# Altium footprint library ref-packages.PCBLIB: 1543 footprints (part 49 of 103)
Each footprint in its own frame and in the unit in brackets; x right, y up, seen from the top. Pads: shape width x height; smd on the part's side, far side on the other; paste and mask are expansions set on the pad; w line width, h text height; cw(c..) or ccw(c..) is an arc to the next point about the centre after c.
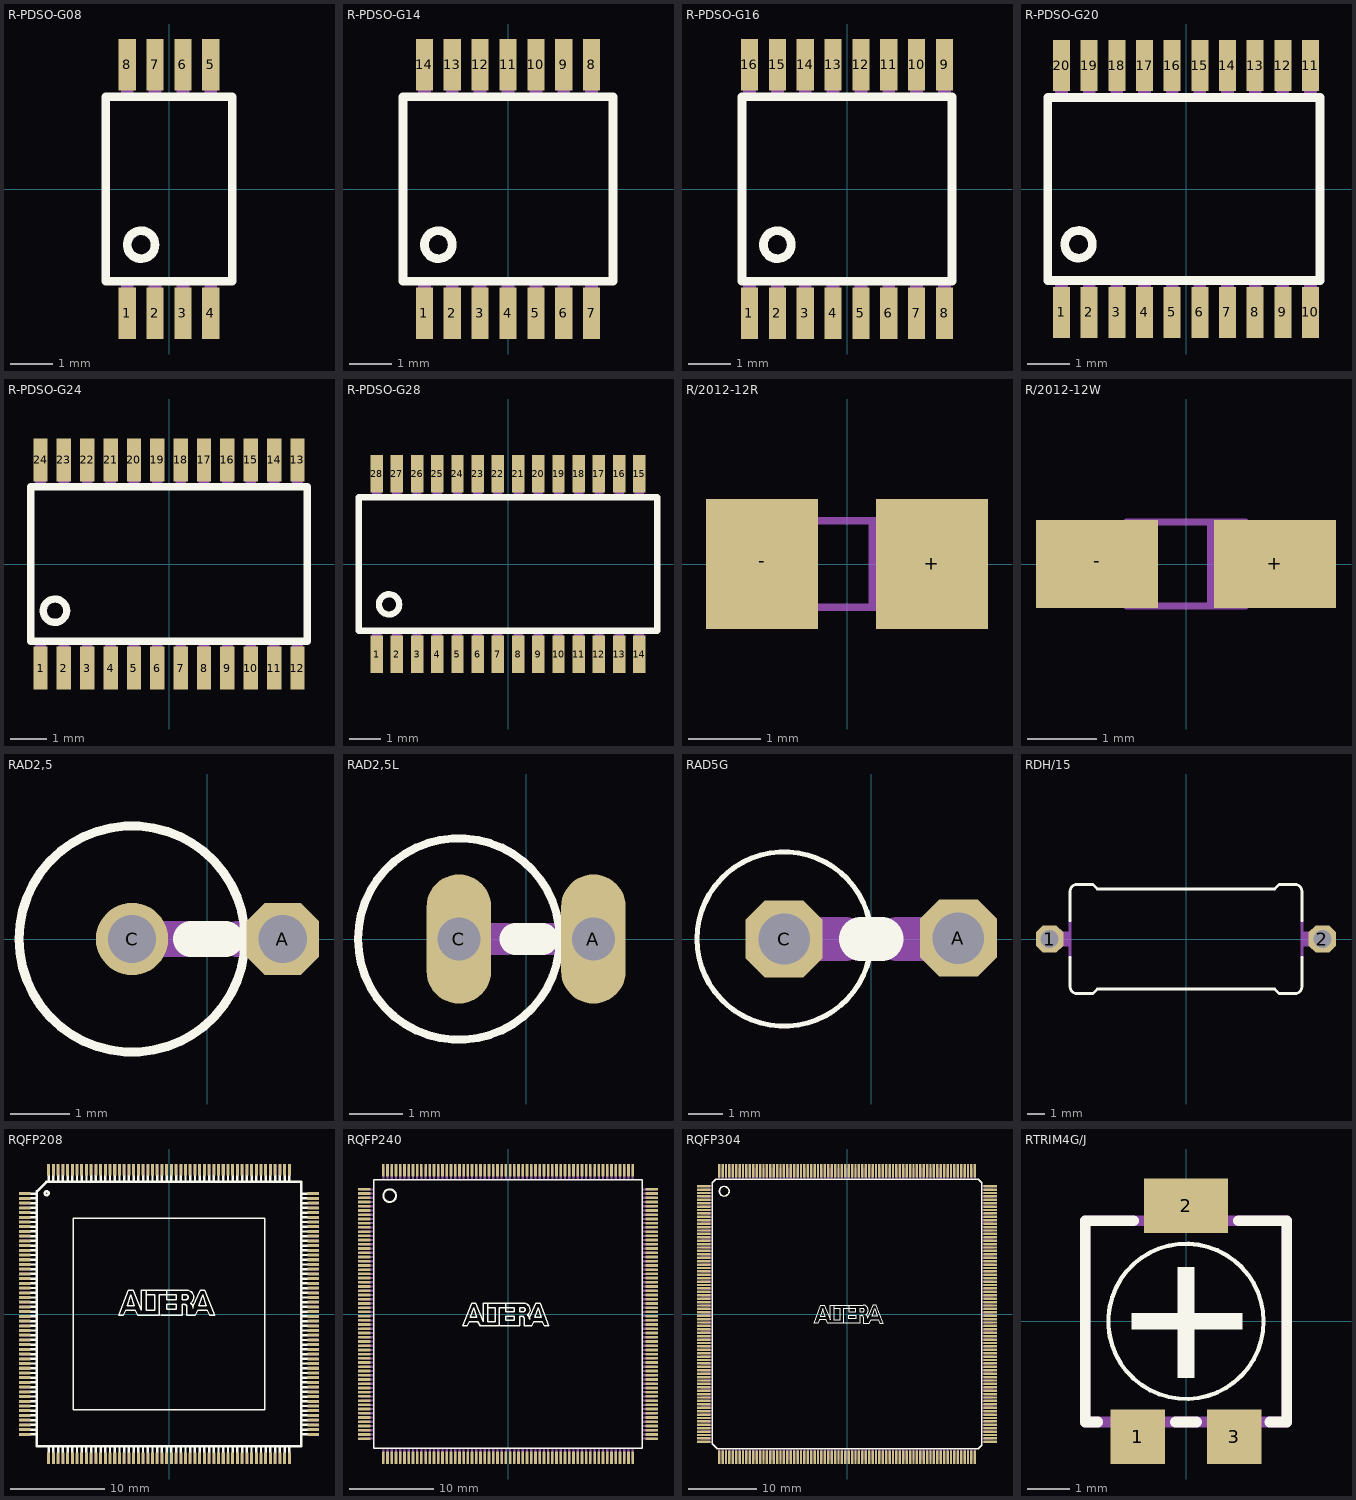
[diagram p48: the footprints below, top view; thin cyan lines are the x and y axes]

## R-PDSO-G08 [mil]
pads (8):
  rect 15.75x47.24 smd: 1(-38.39,-114.17) 2(-12.8,-114.17) 3(12.8,-114.17) 4(38.39,-114.17) 5(38.39,114.17) 6(12.8,114.17) 7(-12.8,114.17) 8(-38.39,114.17)
Top Overlay:
  circle w8: c-25.59,-51.18 r12.8
  lines w8: -58.07,-84.65 58.07,-84.65 58.07,84.65 -58.07,84.65 -58.07,-84.65
Mechanical 16:
  rectangle: -44.29,-129.92 -32.48,-87.8
  rectangle: -18.7,-129.92 -6.89,-87.8
  rectangle: 6.89,-129.92 18.7,-87.8
  rectangle: 32.48,-129.92 44.29,-87.8
  region: 44.29,129.92 32.48,129.92 32.48,87.8 44.29,87.8
  region: 18.7,129.92 6.89,129.92 6.89,87.8 18.7,87.8
  region: -6.89,129.92 -18.7,129.92 -18.7,87.8 -6.89,87.8
  region: -32.48,129.92 -44.29,129.92 -44.29,87.8 -32.48,87.8

## R-PDSO-G14 [mm]
pads (14):
  rect 0.4x1.2 smd: 1(-1.95,-2.9) 2(-1.3,-2.9) 3(-0.65,-2.9) 4(0,-2.9) 5(0.65,-2.9) 6(1.3,-2.9) 7(1.95,-2.9) 8(1.95,2.9) 9(1.3,2.9) 10(0.65,2.9) 11(0,2.9) 12(-0.65,2.9) 13(-1.3,2.9) 14(-1.95,2.9)
Top Overlay:
  circle w0.203: c-1.625,-1.3 r0.325
  lines w0.203: -2.45,-2.15 2.45,-2.15 2.45,2.15 -2.45,2.15 -2.45,-2.15
Mechanical 16:
  rectangle: -2.1,-3.3 -1.8,-2.23
  rectangle: -1.45,-3.3 -1.15,-2.23
  rectangle: -0.8,-3.3 -0.5,-2.23
  rectangle: -0.15,-3.3 0.15,-2.23
  rectangle: 0.5,-3.3 0.8,-2.23
  rectangle: 1.15,-3.3 1.45,-2.23
  rectangle: 1.8,-3.3 2.1,-2.23
  region: 2.1,3.3 1.8,3.3 1.8,2.23 2.1,2.23
  region: 1.45,3.3 1.15,3.3 1.15,2.23 1.45,2.23
  region: 0.8,3.3 0.5,3.3 0.5,2.23 0.8,2.23
  region: 0.15,3.3 -0.15,3.3 -0.15,2.23 0.15,2.23
  region: -0.5,3.3 -0.8,3.3 -0.8,2.23 -0.5,2.23
  region: -1.15,3.3 -1.45,3.3 -1.45,2.23 -1.15,2.23
  region: -1.8,3.3 -2.1,3.3 -2.1,2.23 -1.8,2.23

## R-PDSO-G16 [mil]
pads (16):
  rect 15.75x47.24 smd: 1(-89.57,-114.17) 2(-63.98,-114.17) 3(-38.39,-114.17) 4(-12.8,-114.17) 5(12.8,-114.17) 6(38.39,-114.17) 7(63.98,-114.17) 8(89.57,-114.17) 9(89.57,114.17) 10(63.98,114.17) 11(38.39,114.17) 12(12.8,114.17) 13(-12.8,114.17) 14(-38.39,114.17) 15(-63.98,114.17) 16(-89.57,114.17)
Top Overlay:
  circle w8: c-63.98,-51.18 r12.8
  lines w8: -96.46,-84.65 96.46,-84.65 96.46,84.65 -96.46,84.65 -96.46,-84.65
Mechanical 16:
  rectangle: -95.47,-129.92 -83.66,-87.8
  rectangle: -69.88,-129.92 -58.07,-87.8
  rectangle: -44.29,-129.92 -32.48,-87.8
  rectangle: -18.7,-129.92 -6.89,-87.8
  rectangle: 6.89,-129.92 18.7,-87.8
  rectangle: 32.48,-129.92 44.29,-87.8
  rectangle: 58.07,-129.92 69.88,-87.8
  rectangle: 83.66,-129.92 95.47,-87.8
  region: 95.47,129.92 83.66,129.92 83.66,87.8 95.47,87.8
  region: 69.88,129.92 58.07,129.92 58.07,87.8 69.88,87.8
  region: 44.29,129.92 32.48,129.92 32.48,87.8 44.29,87.8
  region: 18.7,129.92 6.89,129.92 6.89,87.8 18.7,87.8
  region: -6.89,129.92 -18.7,129.92 -18.7,87.8 -6.89,87.8
  region: -32.48,129.92 -44.29,129.92 -44.29,87.8 -32.48,87.8
  region: -58.07,129.92 -69.88,129.92 -69.88,87.8 -58.07,87.8
  region: -83.66,129.92 -95.47,129.92 -95.47,87.8 -83.66,87.8

## R-PDSO-G20 [mil]
pads (20):
  rect 15.75x47.24 smd: 1(-115.16,-114.17) 2(-89.57,-114.17) 3(-63.98,-114.17) 4(-38.39,-114.17) 5(-12.8,-114.17) 6(12.8,-114.17) 7(38.39,-114.17) 8(63.98,-114.17) 9(89.57,-114.17) 10(115.16,-114.17) 11(115.16,114.17) 12(89.57,114.17) 13(63.98,114.17) 14(38.39,114.17) 15(12.8,114.17) 16(-12.8,114.17) 17(-38.39,114.17) 18(-63.98,114.17) 19(-89.57,114.17) 20(-115.16,114.17)
Top Overlay:
  circle w8: c-99.41,-51.18 r12.8
  lines w8: -127.95,-84.65 124.02,-84.65 124.02,84.65 -127.95,84.65 -127.95,-84.65
Mechanical 16:
  rectangle: -121.06,-129.92 -109.25,-87.8
  rectangle: -95.47,-129.92 -83.66,-87.8
  rectangle: -69.88,-129.92 -58.07,-87.8
  rectangle: -44.29,-129.92 -32.48,-87.8
  rectangle: -18.7,-129.92 -6.89,-87.8
  rectangle: 6.89,-129.92 18.7,-87.8
  rectangle: 32.48,-129.92 44.29,-87.8
  rectangle: 58.07,-129.92 69.88,-87.8
  rectangle: 83.66,-129.92 95.47,-87.8
  rectangle: 109.25,-129.92 121.06,-87.8
  region: 121.06,129.92 109.25,129.92 109.25,87.8 121.06,87.8
  region: 95.47,129.92 83.66,129.92 83.66,87.8 95.47,87.8
  region: 69.88,129.92 58.07,129.92 58.07,87.8 69.88,87.8
  region: 44.29,129.92 32.48,129.92 32.48,87.8 44.29,87.8
  region: 18.7,129.92 6.89,129.92 6.89,87.8 18.7,87.8
  region: -6.89,129.92 -18.7,129.92 -18.7,87.8 -6.89,87.8
  region: -32.48,129.92 -44.29,129.92 -44.29,87.8 -32.48,87.8
  region: -58.07,129.92 -69.88,129.92 -69.88,87.8 -58.07,87.8
  region: -83.66,129.92 -95.47,129.92 -95.47,87.8 -83.66,87.8
  region: -109.25,129.92 -121.06,129.92 -121.06,87.8 -109.25,87.8

## R-PDSO-G24 [mil]
pads (24):
  rect 15.75x47.24 smd: 1(-140.75,-114.17) 2(-115.16,-114.17) 3(-89.57,-114.17) 4(-63.98,-114.17) 5(-38.39,-114.17) 6(-12.8,-114.17) 7(12.8,-114.17) 8(38.39,-114.17) 9(63.98,-114.17) 10(89.57,-114.17) 11(115.16,-114.17) 12(140.75,-114.17) 13(140.75,114.17) 14(115.16,114.17) 15(89.57,114.17) 16(63.98,114.17) 17(38.39,114.17) 18(12.8,114.17) 19(-12.8,114.17) 20(-38.39,114.17) 21(-63.98,114.17) 22(-89.57,114.17) 23(-115.16,114.17) 24(-140.75,114.17)
Top Overlay:
  circle w8: c-125,-51.18 r12.8
  lines w8: -151.57,-84.65 151.57,-84.65 151.57,84.65 -151.57,84.65 -151.57,-84.65
Mechanical 16:
  rectangle: -146.65,-129.92 -134.84,-87.8
  rectangle: -121.06,-129.92 -109.25,-87.8
  rectangle: -95.47,-129.92 -83.66,-87.8
  rectangle: -69.88,-129.92 -58.07,-87.8
  rectangle: -44.29,-129.92 -32.48,-87.8
  rectangle: -18.7,-129.92 -6.89,-87.8
  rectangle: 6.89,-129.92 18.7,-87.8
  rectangle: 32.48,-129.92 44.29,-87.8
  rectangle: 58.07,-129.92 69.88,-87.8
  rectangle: 83.66,-129.92 95.47,-87.8
  rectangle: 109.25,-129.92 121.06,-87.8
  rectangle: 134.84,-129.92 146.65,-87.8
  region: 146.65,129.92 134.84,129.92 134.84,87.8 146.65,87.8
  region: 121.06,129.92 109.25,129.92 109.25,87.8 121.06,87.8
  region: 95.47,129.92 83.66,129.92 83.66,87.8 95.47,87.8
  region: 69.88,129.92 58.07,129.92 58.07,87.8 69.88,87.8
  region: 44.29,129.92 32.48,129.92 32.48,87.8 44.29,87.8
  region: 18.7,129.92 6.89,129.92 6.89,87.8 18.7,87.8
  region: -6.89,129.92 -18.7,129.92 -18.7,87.8 -6.89,87.8
  region: -32.48,129.92 -44.29,129.92 -44.29,87.8 -32.48,87.8
  region: -58.07,129.92 -69.88,129.92 -69.88,87.8 -58.07,87.8
  region: -83.66,129.92 -95.47,129.92 -95.47,87.8 -83.66,87.8
  region: -109.25,129.92 -121.06,129.92 -121.06,87.8 -109.25,87.8
  region: -134.84,129.92 -146.65,129.92 -146.65,87.8 -134.84,87.8

## R-PDSO-G28 [mil]
pads (28):
  rect 15.75x47.24 smd: 1(-166.34,-114.17) 2(-140.75,-114.17) 3(-115.16,-114.17) 4(-89.57,-114.17) 5(-63.98,-114.17) 6(-38.39,-114.17) 7(-12.8,-114.17) 8(12.8,-114.17) 9(38.39,-114.17) 10(63.98,-114.17) 11(89.57,-114.17) 12(115.16,-114.17) 13(140.75,-114.17) 14(166.34,-114.17) 15(166.34,114.17) 16(140.75,114.17) 17(115.16,114.17) 18(89.57,114.17) 19(63.98,114.17) 20(38.39,114.17) 21(12.8,114.17) 22(-12.8,114.17) 23(-38.39,114.17) 24(-63.98,114.17) 25(-89.57,114.17) 26(-115.16,114.17) 27(-140.75,114.17) 28(-166.34,114.17)
Top Overlay:
  circle w8: c-150.59,-51.18 r12.8
  lines w8: -188.98,-84.65 188.98,-84.65 188.98,84.65 -188.98,84.65 -188.98,-84.65
Mechanical 16:
  rectangle: -172.24,-129.92 -160.43,-87.8
  rectangle: -146.65,-129.92 -134.84,-87.8
  rectangle: -121.06,-129.92 -109.25,-87.8
  rectangle: -95.47,-129.92 -83.66,-87.8
  rectangle: -69.88,-129.92 -58.07,-87.8
  rectangle: -44.29,-129.92 -32.48,-87.8
  rectangle: -18.7,-129.92 -6.89,-87.8
  rectangle: 6.89,-129.92 18.7,-87.8
  rectangle: 32.48,-129.92 44.29,-87.8
  rectangle: 58.07,-129.92 69.88,-87.8
  rectangle: 83.66,-129.92 95.47,-87.8
  rectangle: 109.25,-129.92 121.06,-87.8
  rectangle: 134.84,-129.92 146.65,-87.8
  rectangle: 160.43,-129.92 172.24,-87.8
  region: 172.24,129.92 160.43,129.92 160.43,87.8 172.24,87.8
  region: 146.65,129.92 134.84,129.92 134.84,87.8 146.65,87.8
  region: 121.06,129.92 109.25,129.92 109.25,87.8 121.06,87.8
  region: 95.47,129.92 83.66,129.92 83.66,87.8 95.47,87.8
  region: 69.88,129.92 58.07,129.92 58.07,87.8 69.88,87.8
  region: 44.29,129.92 32.48,129.92 32.48,87.8 44.29,87.8
  region: 18.7,129.92 6.89,129.92 6.89,87.8 18.7,87.8
  region: -6.89,129.92 -18.7,129.92 -18.7,87.8 -6.89,87.8
  region: -32.48,129.92 -44.29,129.92 -44.29,87.8 -32.48,87.8
  region: -58.07,129.92 -69.88,129.92 -69.88,87.8 -58.07,87.8
  region: -83.66,129.92 -95.47,129.92 -95.47,87.8 -83.66,87.8
  region: -109.25,129.92 -121.06,129.92 -121.06,87.8 -109.25,87.8
  region: -134.84,129.92 -146.65,129.92 -146.65,87.8 -134.84,87.8
  region: -160.43,129.92 -172.24,129.92 -172.24,87.8 -160.43,87.8

## R/2012-12R [mm]
pads (2):
  rect 1.55x1.8 smd: +(1.175,0) -(-1.175,0)
Mechanical 16:
  rectangle: -1,-0.45 -0.875,0.45
  rectangle: 0.875,-0.45 1,0.45
  rectangle: 0.3,-0.625 0.5,0.625
  lines w0.102: -0.85,-0.6 0.85,-0.6 0.85,0.6 -0.85,0.6 -0.85,-0.6

## R/2012-12W [mil]
pads (2):
  rect 68.9x49.61 smd: +(50.2,0) -(-50.2,0)
Mechanical 16:
  rectangle: -39.37,-17.72 -34.45,17.72
  rectangle: 34.45,-17.72 39.37,17.72
  rectangle: 11.81,-24.61 19.69,24.61
  lines w4: -33.46,-23.62 33.46,-23.62 33.46,23.62 -33.46,23.62 -33.46,-23.62

## RAD2,5 [mil]
pads (2):
  oct 48x48 hole 32: A(50,0)
  round 48 hole 32: C(-50,0)
Top Overlay:
  circle w6: c-50,0 r75
  lines w24: -11,0 12,0
Mechanical 16:
  lines w24: -50,0 -15,0 ; 20,0 50,0

## RAD2,5L [mil]
pads (2):
  oval 48x96 hole 32: A(50,0) C(-50,0)
Top Overlay:
  circle w6: c-50,0 r75
  lines w24: -8,0 12,0
Mechanical 16:
  lines w24: -50,0 -15,0 ; 15,0 50,0

## RAD5G [mil]
pads (2):
  oct 88.5x88.5 hole 59: A(100,1) C(-100,0)
Top Overlay:
  circle w6: c-100,0 r100
  lines w50: -12,0 12,0
Mechanical 16:
  lines w50: -100,0 -30,0 ; 30,0 100,0

## RDH/15 [mil]
pads (2):
  oct 60x60 hole 40: 1(-300,0) 2(300,0)
Top Overlay:
  lines w6: -255,-40 -255,-105 ccw(c-240,-105) -240,-120 -205,-120 -195,-110 195,-110 205,-120 240,-120 ccw(c240,-105) 255,-105 255,-40 ; -255,40 -255,105 cw(c-240,105) -240,120 -205,120 -195,110 195,110 205,120 240,120 cw(c240,105) 255,105 255,40
Mechanical 16:
  rectangle: -266,-16 -254,16
  rectangle: 254,-16 266,16
  lines w6: -255,-40 -255,40 ; 255,-40 255,40
  lines w32: -300,0 -270,0 ; 270,0 300,0
  text "RDH" at 180,-68 h77.5

## RQFP208 [mil]
pads (208):
  rect 47.24x12.6 smd: 1(-602.36,501.97) 2(-602.36,482.28) 3(-602.36,462.6) 4(-602.36,442.91) 5(-602.36,423.23) 6(-602.36,403.54) 7(-602.36,383.86) 8(-602.36,364.17) 9(-602.36,344.49) 10(-602.36,324.8) 11(-602.36,305.12) 12(-602.36,285.43) 13(-602.36,265.75) 14(-602.36,246.06) 15(-602.36,226.38) 16(-602.36,206.69) 17(-602.36,187.01) 18(-602.36,167.32) 19(-602.36,147.64) 20(-602.36,127.95) 21(-602.36,108.27) 22(-602.36,88.58) 23(-602.36,68.9) 24(-602.36,49.21) 25(-602.36,29.53) 26(-602.36,9.84) 27(-602.36,-9.84) 28(-602.36,-29.53) 29(-602.36,-49.21) 30(-602.36,-68.9) 31(-602.36,-88.58) 32(-602.36,-108.27) 33(-602.36,-127.95) 34(-602.36,-147.64) 35(-602.36,-167.32) 36(-602.36,-187.01) 37(-602.36,-206.69) 38(-602.36,-226.38) 39(-602.36,-246.06) 40(-602.36,-265.75) 41(-602.36,-285.43) 42(-602.36,-305.12) 43(-602.36,-324.8) 44(-602.36,-344.49) 45(-602.36,-364.17) 46(-602.36,-383.86) 47(-602.36,-403.54) 48(-602.36,-423.23) 49(-602.36,-442.91) 50(-602.36,-462.6) 51(-602.36,-482.28) 52(-602.36,-501.97) 105(602.36,-501.97) 106(602.36,-482.28) 107(602.36,-462.6) 108(602.36,-442.91) 109(602.36,-423.23) 110(602.36,-403.54) 111(602.36,-383.86) 112(602.36,-364.17) 113(602.36,-344.49) 114(602.36,-324.8) 115(602.36,-305.12) 116(602.36,-285.43) 117(602.36,-265.75) 118(602.36,-246.06) 119(602.36,-226.38) 120(602.36,-206.69) 121(602.36,-187.01) 122(602.36,-167.32) 123(602.36,-147.64) 124(602.36,-127.95) 125(602.36,-108.27) 126(602.36,-88.58) 127(602.36,-68.9) 128(602.36,-49.21) 129(602.36,-29.53) 130(602.36,-9.84) 131(602.36,9.84) 132(602.36,29.53) 133(602.36,49.21) 134(602.36,68.9) 135(602.36,88.58) 136(602.36,108.27) 137(602.36,127.95) 138(602.36,147.64) 139(602.36,167.32) 140(602.36,187.01) 141(602.36,206.69) 142(602.36,226.38) 143(602.36,246.06) 144(602.36,265.75) 145(602.36,285.43) 146(602.36,305.12) 147(602.36,324.8) 148(602.36,344.49) 149(602.36,364.17) 150(602.36,383.86) 151(602.36,403.54) 152(602.36,423.23) 153(602.36,442.91) 154(602.36,462.6) 155(602.36,482.28) 156(602.36,501.97)
  rect 12.6x47.24 smd: 53(-501.97,-602.36) 54(-482.28,-602.36) 55(-462.6,-602.36) 56(-442.91,-602.36) 57(-423.23,-602.36) 58(-403.54,-602.36) 59(-383.86,-602.36) 60(-364.17,-602.36) 61(-344.49,-602.36) 62(-324.8,-602.36) 63(-305.12,-602.36) 64(-285.43,-602.36) 65(-265.75,-602.36) 66(-246.06,-602.36) 67(-226.38,-602.36) 68(-206.69,-602.36) 69(-187.01,-602.36) 70(-167.32,-602.36) 71(-147.64,-602.36) 72(-127.95,-602.36) 73(-108.27,-602.36) 74(-88.58,-602.36) 75(-68.9,-602.36) 76(-49.21,-602.36) 77(-29.53,-602.36) 78(-9.84,-602.36) 79(9.84,-602.36) 80(29.53,-602.36) 81(49.21,-602.36) 82(68.9,-602.36) 83(88.58,-602.36) 84(108.27,-602.36) 85(127.95,-602.36) 86(147.64,-602.36) 87(167.32,-602.36) 88(187.01,-602.36) 89(206.69,-602.36) 90(226.38,-602.36) 91(246.06,-602.36) 92(265.75,-602.36) 93(285.43,-602.36) 94(305.12,-602.36) 95(324.8,-602.36) 96(344.49,-602.36) 97(364.17,-602.36) 98(383.86,-602.36) 99(403.54,-602.36) 100(423.23,-602.36) 101(442.91,-602.36) 102(462.6,-602.36) 103(482.28,-602.36) 104(501.97,-602.36) 157(501.97,602.36) 158(482.28,602.36) 159(462.6,602.36) 160(442.91,602.36) 161(423.23,602.36) 162(403.54,602.36) 163(383.86,602.36) 164(364.17,602.36) 165(344.49,602.36) 166(324.8,602.36) 167(305.12,602.36) 168(285.43,602.36) 169(265.75,602.36) 170(246.06,602.36) 171(226.38,602.36) 172(206.69,602.36) 173(187.01,602.36) 174(167.32,602.36) 175(147.64,602.36) 176(127.95,602.36) 177(108.27,602.36) 178(88.58,602.36) 179(68.9,602.36) 180(49.21,602.36) 181(29.53,602.36) 182(9.84,602.36) 183(-9.84,602.36) 184(-29.53,602.36) 185(-49.21,602.36) 186(-68.9,602.36) 187(-88.58,602.36) 188(-108.27,602.36) 189(-127.95,602.36) 190(-147.64,602.36) 191(-167.32,602.36) 192(-187.01,602.36) 193(-206.69,602.36) 194(-226.38,602.36) 195(-246.06,602.36) 196(-265.75,602.36) 197(-285.43,602.36) 198(-305.12,602.36) 199(-324.8,602.36) 200(-344.49,602.36) 201(-364.17,602.36) 202(-383.86,602.36) 203(-403.54,602.36) 204(-423.23,602.36) 205(-442.91,602.36) 206(-462.6,602.36) 207(-482.28,602.36) 208(-501.97,602.36)
Top Overlay:
  drawing of 271 lines, arcs and shapes, not listed
Mechanical 16:
  drawing of 208 lines, arcs and shapes, not listed
  text "RQFP 208" at -130.31,-80.31 h49.6

## RQFP240 [mil]
pads (240):
  rect 59.06x12.6 smd: 1(-669.29,580.71) 2(-669.29,561.02) 3(-669.29,541.34) 4(-669.29,521.65) 5(-669.29,501.97) 6(-669.29,482.28) 7(-669.29,462.6) 8(-669.29,442.91) 9(-669.29,423.23) 10(-669.29,403.54) 11(-669.29,383.86) 12(-669.29,364.17) 13(-669.29,344.49) 14(-669.29,324.8) 15(-669.29,305.12) 16(-669.29,285.43) 17(-669.29,265.75) 18(-669.29,246.06) 19(-669.29,226.38) 20(-669.29,206.69) 21(-669.29,187.01) 22(-669.29,167.32) 23(-669.29,147.64) 24(-669.29,127.95) 25(-669.29,108.27) 26(-669.29,88.58) 27(-669.29,68.9) 28(-669.29,49.21) 29(-669.29,29.53) 30(-669.29,9.84) 31(-669.29,-9.84) 32(-669.29,-29.53) 33(-669.29,-49.21) 34(-669.29,-68.9) 35(-669.29,-88.58) 36(-669.29,-108.27) 37(-669.29,-127.95) 38(-669.29,-147.64) 39(-669.29,-167.32) 40(-669.29,-187.01) 41(-669.29,-206.69) 42(-669.29,-226.38) 43(-669.29,-246.06) 44(-669.29,-265.75) 45(-669.29,-285.43) 46(-669.29,-305.12) 47(-669.29,-324.8) 48(-669.29,-344.49) 49(-669.29,-364.17) 50(-669.29,-383.86) 51(-669.29,-403.54) 52(-669.29,-423.23) 53(-669.29,-442.91) 54(-669.29,-462.6) 55(-669.29,-482.28) 56(-669.29,-501.97) 57(-669.29,-521.65) 58(-669.29,-541.34) 59(-669.29,-561.02) 60(-669.29,-580.71) 121(669.29,-580.71) 122(669.29,-561.02) 123(669.29,-541.34) 124(669.29,-521.65) 125(669.29,-501.97) 126(669.29,-482.28) 127(669.29,-462.6) 128(669.29,-442.91) 129(669.29,-423.23) 130(669.29,-403.54) 131(669.29,-383.86) 132(669.29,-364.17) 133(669.29,-344.49) 134(669.29,-324.8) 135(669.29,-305.12) 136(669.29,-285.43) 137(669.29,-265.75) 138(669.29,-246.06) 139(669.29,-226.38) 140(669.29,-206.69) 141(669.29,-187.01) 142(669.29,-167.32) 143(669.29,-147.64) 144(669.29,-127.95) 145(669.29,-108.27) 146(669.29,-88.58) 147(669.29,-68.9) 148(669.29,-49.21) 149(669.29,-29.53) 150(669.29,-9.84) 151(669.29,9.84) 152(669.29,29.53) 153(669.29,49.21) 154(669.29,68.9) 155(669.29,88.58) 156(669.29,108.27) 157(669.29,127.95) 158(669.29,147.64) 159(669.29,167.32) 160(669.29,187.01) 161(669.29,206.69) 162(669.29,226.38) 163(669.29,246.06) 164(669.29,265.75) 165(669.29,285.43) 166(669.29,305.12) 167(669.29,324.8) 168(669.29,344.49) 169(669.29,364.17) 170(669.29,383.86) 171(669.29,403.54) 172(669.29,423.23) 173(669.29,442.91) 174(669.29,462.6) 175(669.29,482.28) 176(669.29,501.97) 177(669.29,521.65) 178(669.29,541.34) 179(669.29,561.02) 180(669.29,580.71)
  rect 12.6x59.06 smd: 61(-580.71,-669.29) 62(-561.02,-669.29) 63(-541.34,-669.29) 64(-521.65,-669.29) 65(-501.97,-669.29) 66(-482.28,-669.29) 67(-462.6,-669.29) 68(-442.91,-669.29) 69(-423.23,-669.29) 70(-403.54,-669.29) 71(-383.86,-669.29) 72(-364.17,-669.29) 73(-344.49,-669.29) 74(-324.8,-669.29) 75(-305.12,-669.29) 76(-285.43,-669.29) 77(-265.75,-669.29) 78(-246.06,-669.29) 79(-226.38,-669.29) 80(-206.69,-669.29) 81(-187.01,-669.29) 82(-167.32,-669.29) 83(-147.64,-669.29) 84(-127.95,-669.29) 85(-108.27,-669.29) 86(-88.58,-669.29) 87(-68.9,-669.29) 88(-49.21,-669.29) 89(-29.53,-669.29) 90(-9.84,-669.29) 91(9.84,-669.29) 92(29.53,-669.29) 93(49.21,-669.29) 94(68.9,-669.29) 95(88.58,-669.29) 96(108.27,-669.29) 97(127.95,-669.29) 98(147.64,-669.29) 99(167.32,-669.29) 100(187.01,-669.29) 101(206.69,-669.29) 102(226.38,-669.29) 103(246.06,-669.29) 104(265.75,-669.29) 105(285.43,-669.29) 106(305.12,-669.29) 107(324.8,-669.29) 108(344.49,-669.29) 109(364.17,-669.29) 110(383.86,-669.29) 111(403.54,-669.29) 112(423.23,-669.29) 113(442.91,-669.29) 114(462.6,-669.29) 115(482.28,-669.29) 116(501.97,-669.29) 117(521.65,-669.29) 118(541.34,-669.29) 119(561.02,-669.29) 120(580.71,-669.29) 181(580.71,669.29) 182(561.02,669.29) 183(541.34,669.29) 184(521.65,669.29) 185(501.97,669.29) 186(482.28,669.29) 187(462.6,669.29) 188(442.91,669.29) 189(423.23,669.29) 190(403.54,669.29) 191(383.86,669.29) 192(364.17,669.29) 193(344.49,669.29) 194(324.8,669.29) 195(305.12,669.29) 196(285.43,669.29) 197(265.75,669.29) 198(246.06,669.29) 199(226.38,669.29) 200(206.69,669.29) 201(187.01,669.29) 202(167.32,669.29) 203(147.64,669.29) 204(127.95,669.29) 205(108.27,669.29) 206(88.58,669.29) 207(68.9,669.29) 208(49.21,669.29) 209(29.53,669.29) 210(9.84,669.29) 211(-9.84,669.29) 212(-29.53,669.29) 213(-49.21,669.29) 214(-68.9,669.29) 215(-88.58,669.29) 216(-108.27,669.29) 217(-127.95,669.29) 218(-147.64,669.29) 219(-167.32,669.29) 220(-187.01,669.29) 221(-206.69,669.29) 222(-226.38,669.29) 223(-246.06,669.29) 224(-265.75,669.29) 225(-285.43,669.29) 226(-305.12,669.29) 227(-324.8,669.29) 228(-344.49,669.29) 229(-364.17,669.29) 230(-383.86,669.29) 231(-403.54,669.29) 232(-423.23,669.29) 233(-442.91,669.29) 234(-462.6,669.29) 235(-482.28,669.29) 236(-501.97,669.29) 237(-521.65,669.29) 238(-541.34,669.29) 239(-561.02,669.29) 240(-580.71,669.29)
Top Overlay:
  circle w10: c-551.18,551.18 r29.53
  lines w6: -35,-55 55,-55 55,-10 65,-10 cw(c65,-20) 75,-20 75,-55 110,-55 120,-35 160,-35 170,-55 190,-55 150,50 130,50 100,-20 ; 90,-5.03 ccw(c72.5,19.76) 75,50 -10,50 ; 90,-5 cw(c82.5,-21.24) 99.99,-25 ; -95,30 -95,50 ; -95,30 -95,-35 -60,-35 -60,30 -95,30 ; -95,50 -115,50 -115,-35 -150,50 -170,50 -210,-55 -190,-55 -180,-35 -140,-35 -130,-55 -40,-55 -40,30 -10,30 ; -95,50 -10,50 ; -10,30 -10,50 ; -10,30 -10,10 30,10 30,30 -10,30 ; -175,-15 -160,30 -145,-15 -175,-15 ; -10,-30 30,-30 30,-10 -10,-10 -10,-30 ; 55,10 55,30 70,30 cw(c70,20) 70,10 55,10 ; 125,-15 155,-15 140,30 125,-15
  lines w8: -625.98,-625.98 625.98,-625.98 625.98,625.98 -625.98,625.98 -625.98,-625.98
Mechanical 16:
  drawing of 480 lines, arcs and shapes, not listed
  text "RQFP240" at -130.31,-130.31 h49.6

## RQFP304 [mm]
pads (304):
  rect 2x0.35 smd: 1(-21,18.75) 2(-21,18.25) 3(-21,17.75) 4(-21,17.25) 5(-21,16.75) 6(-21,16.25) 7(-21,15.75) 8(-21,15.25) 9(-21,14.75) 10(-21,14.25) 11(-21,13.75) 12(-21,13.25) 13(-21,12.75) 14(-21,12.25) 15(-21,11.75) 16(-21,11.25) 17(-21,10.75) 18(-21,10.25) 19(-21,9.75) 20(-21,9.25) 21(-21,8.75) 22(-21,8.25) 23(-21,7.75) 24(-21,7.25) 25(-21,6.75) 26(-21,6.25) 27(-21,5.75) 28(-21,5.25) 29(-21,4.75) 30(-21,4.25) 31(-21,3.75) 32(-21,3.25) 33(-21,2.75) 34(-21,2.25) 35(-21,1.75) 36(-21,1.25) 37(-21,0.75) 38(-21,0.25) 39(-21,-0.25) 40(-21,-0.75) 41(-21,-1.25) 42(-21,-1.75) 43(-21,-2.25) 44(-21,-2.75) 45(-21,-3.25) 46(-21,-3.75) 47(-21,-4.25) 48(-21,-4.75) 49(-21,-5.25) 50(-21,-5.75) 51(-21,-6.25) 52(-21,-6.75) 53(-21,-7.25) 54(-21,-7.75) 55(-21,-8.25) 56(-21,-8.75) 57(-21,-9.25) 58(-21,-9.75) 59(-21,-10.25) 60(-21,-10.75) 61(-21,-11.25) 62(-21,-11.75) 63(-21,-12.25) 64(-21,-12.75) 65(-21,-13.25) 66(-21,-13.75) 67(-21,-14.25) 68(-21,-14.75) 69(-21,-15.25) 70(-21,-15.75) 71(-21,-16.25) 72(-21,-16.75) 73(-21,-17.25) 74(-21,-17.75) 75(-21,-18.25) 76(-21,-18.75) 153(21,-18.75) 154(21,-18.25) 155(21,-17.75) 156(21,-17.25) 157(21,-16.75) 158(21,-16.25) 159(21,-15.75) 160(21,-15.25) 161(21,-14.75) 162(21,-14.25) 163(21,-13.75) 164(21,-13.25) 165(21,-12.75) 166(21,-12.25) 167(21,-11.75) 168(21,-11.25) 169(21,-10.75) 170(21,-10.25) 171(21,-9.75) 172(21,-9.25) 173(21,-8.75) 174(21,-8.25) 175(21,-7.75) 176(21,-7.25) 177(21,-6.75) 178(21,-6.25) 179(21,-5.75) 180(21,-5.25) 181(21,-4.75) 182(21,-4.25) 183(21,-3.75) 184(21,-3.25) 185(21,-2.75) 186(21,-2.25) 187(21,-1.75) 188(21,-1.25) 189(21,-0.75) 190(21,-0.25) 191(21,0.25) 192(21,0.75) 193(21,1.25) 194(21,1.75) 195(21,2.25) 196(21,2.75) 197(21,3.25) 198(21,3.75) 199(21,4.25) 200(21,4.75) 201(21,5.25) 202(21,5.75) 203(21,6.25) 204(21,6.75) 205(21,7.25) 206(21,7.75) 207(21,8.25) 208(21,8.75) 209(21,9.25) 210(21,9.75) 211(21,10.25) 212(21,10.75) 213(21,11.25) 214(21,11.75) 215(21,12.25) 216(21,12.75) 217(21,13.25) 218(21,13.75) 219(21,14.25) 220(21,14.75) 221(21,15.25) 222(21,15.75) 223(21,16.25) 224(21,16.75) 225(21,17.25) 226(21,17.75) 227(21,18.25) 228(21,18.75)
  rect 0.35x2 smd: 77(-18.75,-21) 78(-18.25,-21) 79(-17.75,-21) 80(-17.25,-21) 81(-16.75,-21) 82(-16.25,-21) 83(-15.75,-21) 84(-15.25,-21) 85(-14.75,-21) 86(-14.25,-21) 87(-13.75,-21) 88(-13.25,-21) 89(-12.75,-21) 90(-12.25,-21) 91(-11.75,-21) 92(-11.25,-21) 93(-10.75,-21) 94(-10.25,-21) 95(-9.75,-21) 96(-9.25,-21) 97(-8.75,-21) 98(-8.25,-21) 99(-7.75,-21) 100(-7.25,-21) 101(-6.75,-21) 102(-6.25,-21) 103(-5.75,-21) 104(-5.25,-21) 105(-4.75,-21) 106(-4.25,-21) 107(-3.75,-21) 108(-3.25,-21) 109(-2.75,-21) 110(-2.25,-21) 111(-1.75,-21) 112(-1.25,-21) 113(-0.75,-21) 114(-0.25,-21) 115(0.25,-21) 116(0.75,-21) 117(1.25,-21) 118(1.75,-21) 119(2.25,-21) 120(2.75,-21) 121(3.25,-21) 122(3.75,-21) 123(4.25,-21) 124(4.75,-21) 125(5.25,-21) 126(5.75,-21) 127(6.25,-21) 128(6.75,-21) 129(7.25,-21) 130(7.75,-21) 131(8.25,-21) 132(8.75,-21) 133(9.25,-21) 134(9.75,-21) 135(10.25,-21) 136(10.75,-21) 137(11.25,-21) 138(11.75,-21) 139(12.25,-21) 140(12.75,-21) 141(13.25,-21) 142(13.75,-21) 143(14.25,-21) 144(14.75,-21) 145(15.25,-21) 146(15.75,-21) 147(16.25,-21) 148(16.75,-21) 149(17.25,-21) 150(17.75,-21) 151(18.25,-21) 152(18.75,-21) 229(18.75,21) 230(18.25,21) 231(17.75,21) 232(17.25,21) 233(16.75,21) 234(16.25,21) 235(15.75,21) 236(15.25,21) 237(14.75,21) 238(14.25,21) 239(13.75,21) 240(13.25,21) 241(12.75,21) 242(12.25,21) 243(11.75,21) 244(11.25,21) 245(10.75,21) 246(10.25,21) 247(9.75,21) 248(9.25,21) 249(8.75,21) 250(8.25,21) 251(7.75,21) 252(7.25,21) 253(6.75,21) 254(6.25,21) 255(5.75,21) 256(5.25,21) 257(4.75,21) 258(4.25,21) 259(3.75,21) 260(3.25,21) 261(2.75,21) 262(2.25,21) 263(1.75,21) 264(1.25,21) 265(0.75,21) 266(0.25,21) 267(-0.25,21) 268(-0.75,21) 269(-1.25,21) 270(-1.75,21) 271(-2.25,21) 272(-2.75,21) 273(-3.25,21) 274(-3.75,21) 275(-4.25,21) 276(-4.75,21) 277(-5.25,21) 278(-5.75,21) 279(-6.25,21) 280(-6.75,21) 281(-7.25,21) 282(-7.75,21) 283(-8.25,21) 284(-8.75,21) 285(-9.25,21) 286(-9.75,21) 287(-10.25,21) 288(-10.75,21) 289(-11.25,21) 290(-11.75,21) 291(-12.25,21) 292(-12.75,21) 293(-13.25,21) 294(-13.75,21) 295(-14.25,21) 296(-14.75,21) 297(-15.25,21) 298(-15.75,21) 299(-16.25,21) 300(-16.75,21) 301(-17.25,21) 302(-17.75,21) 303(-18.25,21) 304(-18.75,21)
Top Overlay:
  circle w0.203: c-18,18 r0.707
  lines w0.152: -0.389,-1.357 1.897,-1.357 1.897,-0.214 2.151,-0.214 cw(c2.151,-0.468) 2.405,-0.468 2.405,-1.357 3.294,-1.357 3.548,-0.849 4.564,-0.849 4.818,-1.357 5.326,-1.357 4.31,1.31 3.802,1.31 3.04,-0.468 ; 3.04,-0.595 ccw(c2.596,-0.5) 2.786,-0.087 ccw(c2.342,0.542) 2.405,1.31 0.246,1.31 ; -1.913,0.802 -1.913,1.31 ; -1.913,0.802 -1.913,-0.849 -1.024,-0.849 -1.024,0.802 -1.913,0.802 ; -1.913,1.31 -2.421,1.31 -2.421,-0.849 -3.31,1.31 -3.818,1.31 -4.834,-1.357 -4.326,-1.357 -4.072,-0.849 -3.056,-0.849 -2.802,-1.357 -0.516,-1.357 -0.516,0.802 0.246,0.802 ; -1.913,1.31 0.246,1.31 ; 0.246,0.802 0.246,1.31 ; 0.246,0.802 0.246,0.294 1.262,0.294 1.262,0.802 0.246,0.802 ; -3.945,-0.341 -3.564,0.802 -3.183,-0.341 -3.945,-0.341 ; 0.246,-0.722 1.262,-0.722 1.262,-0.214 0.246,-0.214 0.246,-0.722 ; 1.897,0.294 1.897,0.802 2.278,0.802 cw(c2.278,0.548) 2.278,0.294 1.897,0.294 ; 3.675,-0.341 4.437,-0.341 4.056,0.802 3.675,-0.341
  lines w0.203: -19.75,-19 -19,-19.75 19.25,-19.75 19.75,-19.25 19.75,19.25 19.25,19.75 -19.25,19.75 -19.75,19.25 -19.75,-19
Mechanical 16:
  drawing of 304 lines, arcs and shapes, not listed
  text "RQFP304" at -2.81,-3.27 h1.26

## RTRIM4G/J [mm]
pads (3):
  rect 1.3x1.3 smd: 1(-1.15,-2.75) 3(1.15,-2.75)
  rect 2x1.3 smd: 2(0,2.75)
Top Overlay:
  circle w0.102: c0,0 r1.85
  rectangle: -1.3,-0.2 1.35,0.2
  rectangle: -0.2,-1.35 0.2,1.3
  lines w0.254: -2.1,-2.4 -2.4,-2.4 -2.4,2.4 -1.25,2.4 ; -0.25,-2.4 0.25,-2.4 ; 1.25,2.4 2.4,2.4 2.4,-2.4 2,-2.4
Mechanical 16:
  lines w0.254: -2.4,-2.4 -2.4,2.4 2.4,2.4 2.4,-2.4 -2.4,-2.4